# Altium footprint library PSU_lib.PcbLib: 108 footprints (part 1 of 7)
Each footprint in its own frame and in the unit in brackets; x right, y up, seen from the top. Pads: shape width x height; smd on the part's side, far side on the other; paste and mask are expansions set on the pad; w line width, h text height; cw(c..) or ccw(c..) is an arc to the next point about the centre after c.
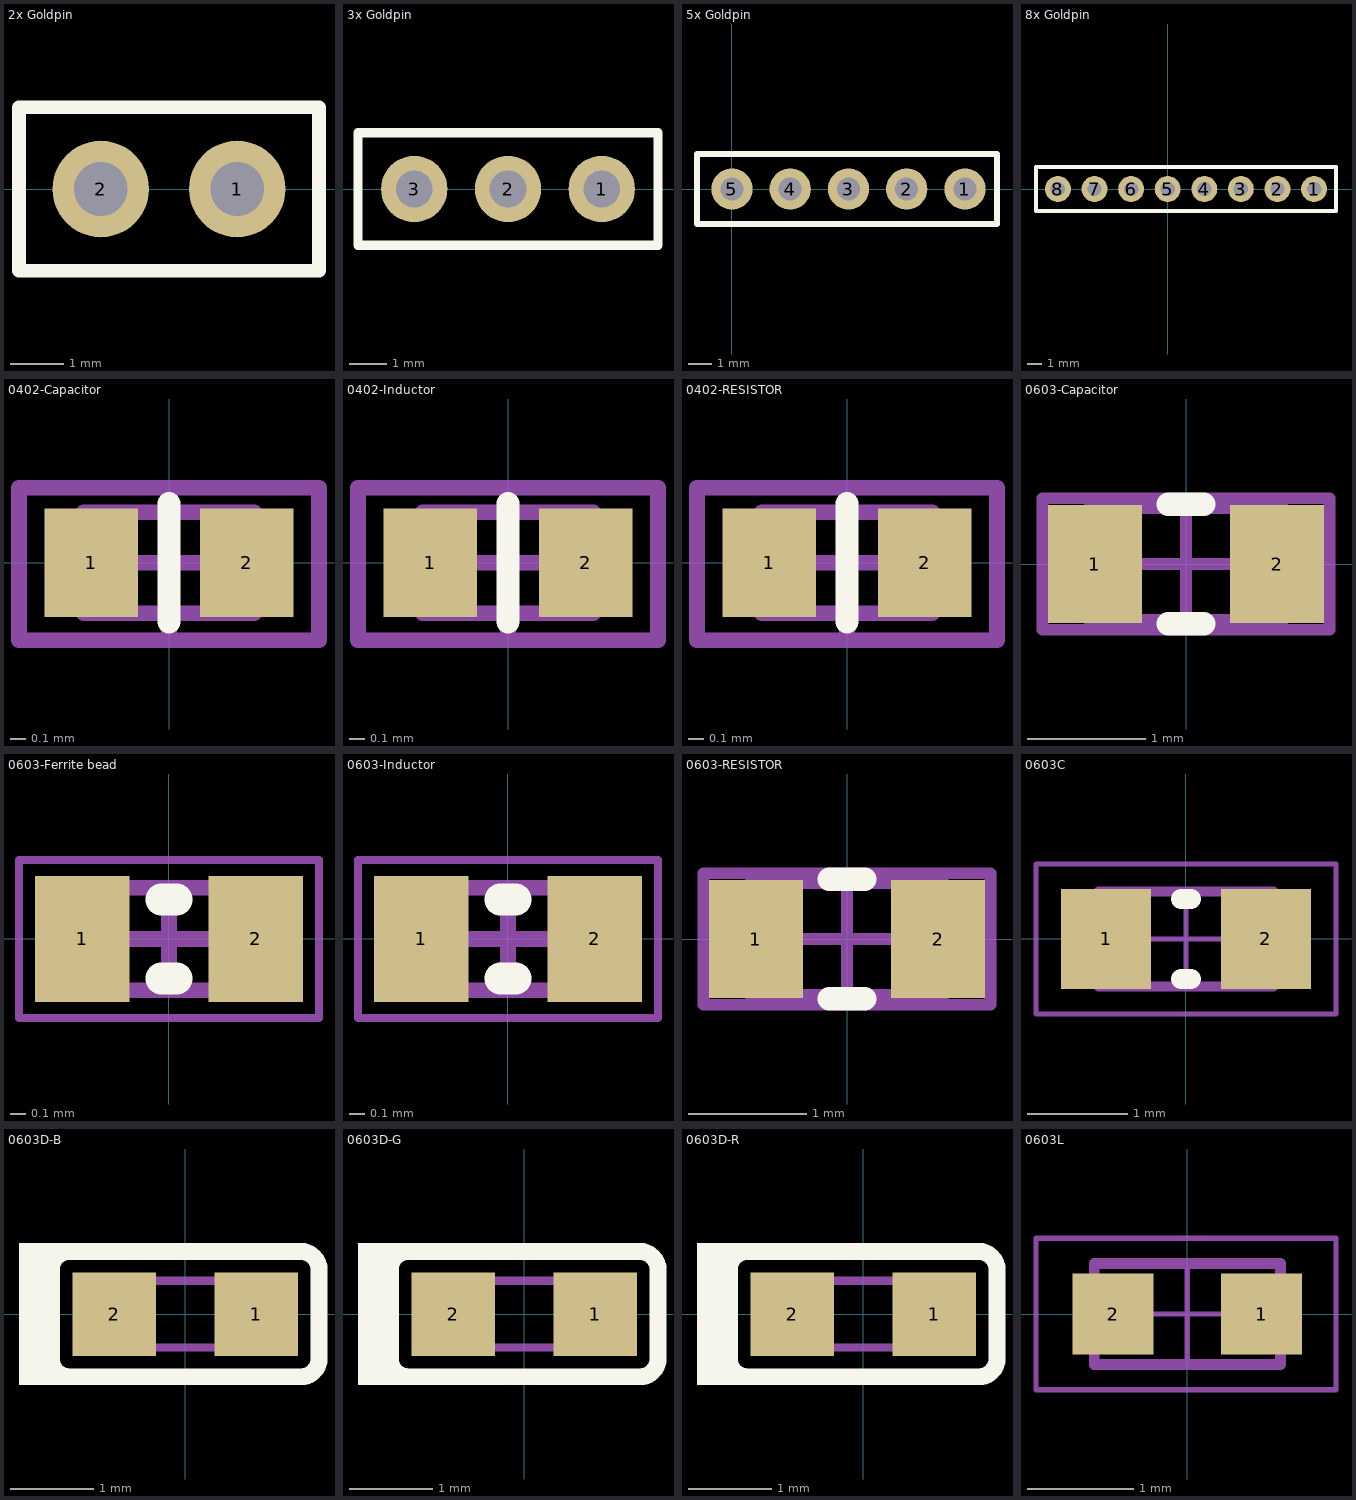
[diagram p0: the footprints below, top view; thin cyan lines are the x and y axes]

## 2x Goldpin [mm] "2x Goldpin 2.56mm"
height 10
pads (2):
  round 1.8 hole 1: 1(10.16,0) 2(7.62,0)
Top Overlay:
  lines w0.254: 6.096,-1.524 11.684,-1.524 11.684,1.524 6.096,1.524 6.096,-1.524
3D body "Pin Header 1x2 TH Pitch 2.54mm.stp": height 9.5, standoff -3.2, extent 6.35,-1.27 11.43,1.27

## 3x Goldpin [mm] "3x Goldpin 2.56mm"
height 10
pads (3):
  round 1.8 hole 1: 1(10.16,0) 2(7.62,0) 3(5.08,0)
Top Overlay:
  lines w0.254: 3.556,-1.524 11.684,-1.524 11.684,1.524 3.556,1.524 3.556,-1.524
3D body "Pin Header 1x3 TH Pitch 2.54mm.stp": height 9.5, standoff -3.2, extent 3.81,-1.27 11.43,1.27

## 5x Goldpin [mm] "5x Goldpin 2.56mm"
height 10
pads (5):
  round 1.8 hole 1: 1(10.16,0) 2(7.62,0) 3(5.08,0) 4(2.54,0) 5(0,0)
Top Overlay:
  lines w0.254: -1.524,-1.524 -1.524,1.524 11.557,1.524 11.557,-1.524 -1.524,-1.524
3D body "Pin Header 1x5 TH Pitch 2.54mm.stp": height 9.5, standoff -3.2, extent -1.27,-1.27 11.43,1.27

## 8x Goldpin [mm] "8x Goldpin 2.56mm"
height 10
pads (8):
  round 1.8 hole 1: 1(10.16,0) 2(7.62,0) 3(5.08,0) 4(2.54,0) 5(0,0) 6(-2.54,0) 7(-5.08,0) 8(-7.62,0)
Top Overlay:
  lines w0.254: -9.144,-1.524 11.684,-1.524 11.684,1.524 -9.144,1.524 -9.144,0.762 -9.144,-0.762 -9.144,-1.524
3D body "Pin Header 1x8 TH Pitch 2.54mm.stp": height 9.5, standoff -3.2, extent -8.89,-1.27 11.43,1.27

## 0402-Capacitor [mm] "Chip Capacitor, 2-Leads, Body 1,00x0,50mm, IPC Medium Density"
height 0.55
pads (2):
  rect 0.6x0.7 smd paste-0.1: 1(-0.5,0) 2(0.5,0)
Top Overlay:
  lines w0.15: 0,-0.381 0,0.381
Mechanical 13:
  lines w0.1: -0.55,-0.325 0.55,-0.325 0.55,0.325 -0.55,0.325 -0.55,-0.325
Mechanical 15:
  lines w0.1: -0.5,0 0.5,0 ; 0,-0.5 0,0.483 ; -0.965,-0.5 0.965,-0.5 0.965,0.483 -0.965,0.483 -0.965,-0.5
3D body "CAP0402.stp": height 0.2, standoff 0, extent -0.5,-0.3 0.5,0.3

## 0402-Inductor [mm] "0402 Inductor"
height 0.55
pads (2):
  rect 0.6x0.7 smd paste-0.1: 1(-0.5,0) 2(0.5,0)
Top Overlay:
  lines w0.15: 0,-0.381 0,0.381
Mechanical 13:
  lines w0.1: -0.55,-0.325 -0.55,0.325 0.55,0.325 0.55,-0.325 -0.55,-0.325
Mechanical 15:
  lines w0.1: -0.5,0 0.5,0 ; 0,-0.5 0,0.483 ; -0.965,-0.5 -0.965,0.483 0.965,0.483 0.965,-0.5 -0.965,-0.5
3D body "inductor_0402.step": height 0.67, standoff 0.01, extent -0.595,-0.32 0.595,0.32

## 0402-RESISTOR [mm] "Resistor, Capacitor, 2-Leads, Body 1,0x0,5mm, IPC Medium Density"
height 0.35
pads (2):
  rect 0.6x0.7 smd paste-0.1: 1(-0.5,0) 2(0.5,0)
Top Overlay:
  lines w0.15: 0,-0.381 0,0.381
Mechanical 13:
  lines w0.1: -0.55,-0.325 -0.55,0.325 0.55,0.325 0.55,-0.325 -0.55,-0.325
Mechanical 15:
  lines w0.1: -0.5,0 0.5,0 ; 0,-0.5 0,0.483 ; -0.965,-0.5 -0.965,0.483 0.965,0.483 0.965,-0.5 -0.965,-0.5
Mechanical 30:
  lines w0.1: -0.965,-0.5 0.965,-0.5 0.965,0.483 -0.965,0.483 -0.965,-0.5
  text ".Designator" at -1.375,-0.425 h0.8
Mechanical 31:
  lines w0.1: -0.965,-0.5 0.965,-0.5 0.965,0.483 -0.965,0.483 -0.965,-0.5
  text ".Comment" at -1.425,-0.45 h0.8
3D body "RESC-0402.stp": height 0.4, standoff 0, extent -0.525,-0.275 0.525,0.275

## 0603-Capacitor [mm] "Chip Resistor, 2-Leads, Body 1,6x0,8mm, IPC Medium Density"
height 0.5
pads (2):
  rect 0.8x1 smd: 1(-0.775,0) 2(0.775,0)
Top Overlay:
  lines w0.2: -0.152,-0.508 0.152,-0.508 ; -0.152,0.508 0.152,0.508
Mechanical 13:
  lines w0.1: -0.825,-0.475 -0.825,0.475 0.825,0.475 0.825,-0.475 -0.825,-0.475
Mechanical 15:
  lines w0.1: -0.5,0 0.5,0 ; 0,-0.5 0,0.5 ; -1.219,-0.559 -1.219,0.559 1.219,0.559 1.219,-0.559 -1.219,-0.559
Mechanical 30:
  lines w0.1: -1.219,-0.559 1.219,-0.559 1.219,0.559 -1.219,0.559 -1.219,-0.559
  text ".Designator" at -1.675,-0.475 h0.8
Mechanical 31:
  lines w0.1: -1.219,-0.559 1.219,-0.559 1.219,0.559 -1.219,0.559 -1.219,-0.559
  text ".Comment" at -1.725,-0.5 h0.8
3D body "CAP0603.stp": height 0.3, standoff 0, extent -0.8,-0.4 0.8,0.4

## 0603-Ferrite bead [mm] "Inductor 0603"
height 0.8
pads (2):
  rect 0.6x0.8 smd: 1(-0.55,0) 2(0.55,0)
Top Overlay:
  lines w0.2: -0.05,-0.25 0.05,-0.25 ; -0.05,0.25 0.05,0.25
Mechanical 13:
  lines w0.1: -0.725,-0.325 0.725,-0.325 0.725,0.325 -0.725,0.325 -0.725,-0.325
Mechanical 15:
  lines w0.05: -0.95,-0.5 0.95,-0.5 0.95,0.5 -0.95,0.5 -0.95,-0.5
  lines w0.1: -0.325,0 0.325,0 ; 0,-0.325 0,0.325
3D body: height 0.8, standoff 0, extent 0.425,-0.325 0.725,0.325
3D body: height 0.8, standoff 0, extent -0.725,-0.325 -0.425,0.325
3D body: height 0.8, standoff 0, extent -0.425,-0.325 0.425,0.325

## 0603-Inductor [mm] "Inductor 0603"
height 0.8
pads (2):
  rect 0.6x0.8 smd: 1(-0.55,0) 2(0.55,0)
Top Overlay:
  lines w0.2: -0.05,-0.25 0.05,-0.25 ; -0.05,0.25 0.05,0.25
Mechanical 13:
  lines w0.1: -0.725,-0.325 0.725,-0.325 0.725,0.325 -0.725,0.325 -0.725,-0.325
Mechanical 15:
  lines w0.05: -0.95,-0.5 0.95,-0.5 0.95,0.5 -0.95,0.5 -0.95,-0.5
  lines w0.1: -0.325,0 0.325,0 ; 0,-0.325 0,0.325
3D body: height 0.8, standoff 0, extent 0.425,-0.325 0.725,0.325
3D body: height 0.8, standoff 0, extent -0.725,-0.325 -0.425,0.325
3D body: height 0.8, standoff 0, extent -0.425,-0.325 0.425,0.325

## 0603-RESISTOR [mm] "Chip Resistor, 2-Leads, Body 1,6x0,8mm, IPC Medium Density"
height 0.5
pads (2):
  rect 0.8x1 smd: 1(-0.775,0) 2(0.775,0)
Top Overlay:
  lines w0.2: -0.152,-0.508 0.152,-0.508 ; -0.152,0.508 0.152,0.508
Mechanical 13:
  lines w0.1: -0.825,-0.475 -0.825,0.475 0.825,0.475 0.825,-0.475 -0.825,-0.475
Mechanical 15:
  lines w0.1: -0.5,0 0.5,0 ; 0,-0.5 0,0.5 ; -1.219,-0.559 -1.219,0.559 1.219,0.559 1.219,-0.559 -1.219,-0.559
Mechanical 30:
  lines w0.1: -1.219,-0.559 1.219,-0.559 1.219,0.559 -1.219,0.559 -1.219,-0.559
  text ".Designator" at -1.675,-0.475 h0.8
Mechanical 31:
  lines w0.1: -1.219,-0.559 1.219,-0.559 1.219,0.559 -1.219,0.559 -1.219,-0.559
  text ".Comment" at -1.725,-0.5 h0.8
3D body "RESC-0603.stp": height 0.55, standoff 0, extent -0.85,-0.45 0.85,0.45

## 0603C [mm] "Chip Capacitor, Body 1.6x0.8mm, Height 1.0mm, IPC Medium Density"
height 1
pads (2):
  rect 0.9x1 smd: 1(-0.8,0) 2(0.8,0)
Top Overlay:
  lines w0.2: -0.05,-0.4 0.05,-0.4 ; -0.05,0.4 0.05,0.4
Mechanical 13:
  lines w0.1: -0.875,-0.475 0.875,-0.475 0.875,0.475 -0.875,0.475 -0.875,-0.475
Mechanical 15:
  lines w0.05: -0.475,0 0.475,0 ; 0,-0.475 0,0.475 ; -1.5,-0.75 1.5,-0.75 1.5,0.75 -1.5,0.75 -1.5,-0.75
3D body: height 1, standoff 0, extent 0.525,-0.475 0.875,0.475
3D body: height 1, standoff 0, extent -0.875,-0.475 -0.525,0.475
3D body: height 1, standoff 0, extent -0.525,-0.475 0.525,0.475

## 0603D-B [mm] "LED, SMT, Body 1.6 x 0.8 mm, 0.25mm Thickness"
height 0.25
pads (2):
  rect 1x1 smd paste+0 mask+0: 1(0.85,0) 2(-0.85,0)
Top Overlay:
  rectangle: -1.797,-0.849 -1.213,-0.684
  rectangle: -1.988,-0.849 -1.531,0.852
  rectangle: -1.797,0.667 -1.147,0.852
  lines w0.203: -1.602,-0.533 ccw(c-1.386,-0.533) -1.386,-0.749 1.386,-0.749 ccw(c1.386,-0.533) 1.602,-0.533 1.602,0.533 ccw(c1.386,0.533) 1.386,0.749 -1.386,0.749 ccw(c-1.386,0.533) -1.602,0.533 -1.602,-0.533
Mechanical 7:
  lines w0.1: -0.8,-0.4 0.8,-0.4 0.8,0.4 -0.8,0.4 -0.8,-0.4
3D body: height 0.25, standoff 0.1, extent -0.6,-0.4 0.6,0.4
3D body: height 0.2, standoff 0.15, extent -0.254,-0.254 0.254,0.254
3D body: height 0.1, standoff 0, extent -0.8,-0.4 0.8,0.4

## 0603D-G [mm] "LED, SMT, Body 1.6 x 0.8 mm, 0.25mm Thickness"
height 0.25
pads (2):
  rect 1x1 smd paste+0 mask+0: 1(0.85,0) 2(-0.85,0)
Top Overlay:
  rectangle: -1.797,-0.849 -1.213,-0.684
  rectangle: -1.988,-0.849 -1.531,0.852
  rectangle: -1.797,0.667 -1.147,0.852
  lines w0.203: -1.602,-0.533 ccw(c-1.386,-0.533) -1.386,-0.749 1.386,-0.749 ccw(c1.386,-0.533) 1.602,-0.533 1.602,0.533 ccw(c1.386,0.533) 1.386,0.749 -1.386,0.749 ccw(c-1.386,0.533) -1.602,0.533 -1.602,-0.533
Mechanical 7:
  lines w0.1: -0.8,-0.4 0.8,-0.4 0.8,0.4 -0.8,0.4 -0.8,-0.4
3D body: height 0.25, standoff 0.1, extent -0.6,-0.4 0.6,0.4
3D body: height 0.2, standoff 0.15, extent -0.254,-0.254 0.254,0.254
3D body: height 0.1, standoff 0, extent -0.8,-0.4 0.8,0.4

## 0603D-R [mm] "LED, SMT, Body 1.6 x 0.8 mm, 0.25mm Thickness"
height 0.25
pads (2):
  rect 1x1 smd paste+0 mask+0: 1(0.85,0) 2(-0.85,0)
Top Overlay:
  rectangle: -1.797,-0.849 -1.213,-0.684
  rectangle: -1.988,-0.849 -1.531,0.852
  rectangle: -1.797,0.667 -1.147,0.852
  lines w0.203: -1.602,-0.533 ccw(c-1.386,-0.533) -1.386,-0.749 1.386,-0.749 ccw(c1.386,-0.533) 1.602,-0.533 1.602,0.533 ccw(c1.386,0.533) 1.386,0.749 -1.386,0.749 ccw(c-1.386,0.533) -1.602,0.533 -1.602,-0.533
Mechanical 7:
  lines w0.1: -0.8,-0.4 0.8,-0.4 0.8,0.4 -0.8,0.4 -0.8,-0.4
3D body: height 0.25, standoff 0.1, extent -0.6,-0.4 0.6,0.4
3D body: height 0.2, standoff 0.15, extent -0.254,-0.254 0.254,0.254
3D body: height 0.1, standoff 0, extent -0.8,-0.4 0.8,0.4

## 0603L [mil] "Bead 0603L"
height 39.37
pads (2):
  rect 30x30 smd: 1(27.5,0) 2(-27.5,0)
Mechanical 13:
  lines w3.94: -34.45,-18.7 34.45,-18.7 34.45,18.7 -34.45,18.7 -34.45,-18.7
Mechanical 15:
  lines w1.97: -18.7,0 18.7,0 ; 0,-18.7 0,18.7 ; -56,-28 -56,28 55,28 55,-28 -56,-28
3D body: height 23.62, standoff 0, extent 20.67,-18.7 34.45,18.7
3D body: height 23.62, standoff 0, extent -34.45,-18.7 -20.67,18.7
3D body: height 23.62, standoff 0, extent -20.67,-18.7 20.67,18.7